# Altium footprint library PcbLib_jp.PcbLib: 255 footprints (part 13 of 16)
Each footprint in its own frame and in the unit in brackets; x right, y up, seen from the top. Pads: shape width x height; smd on the part's side, far side on the other; paste and mask are expansions set on the pad; w line width, h text height; cw(c..) or ccw(c..) is an arc to the next point about the centre after c.
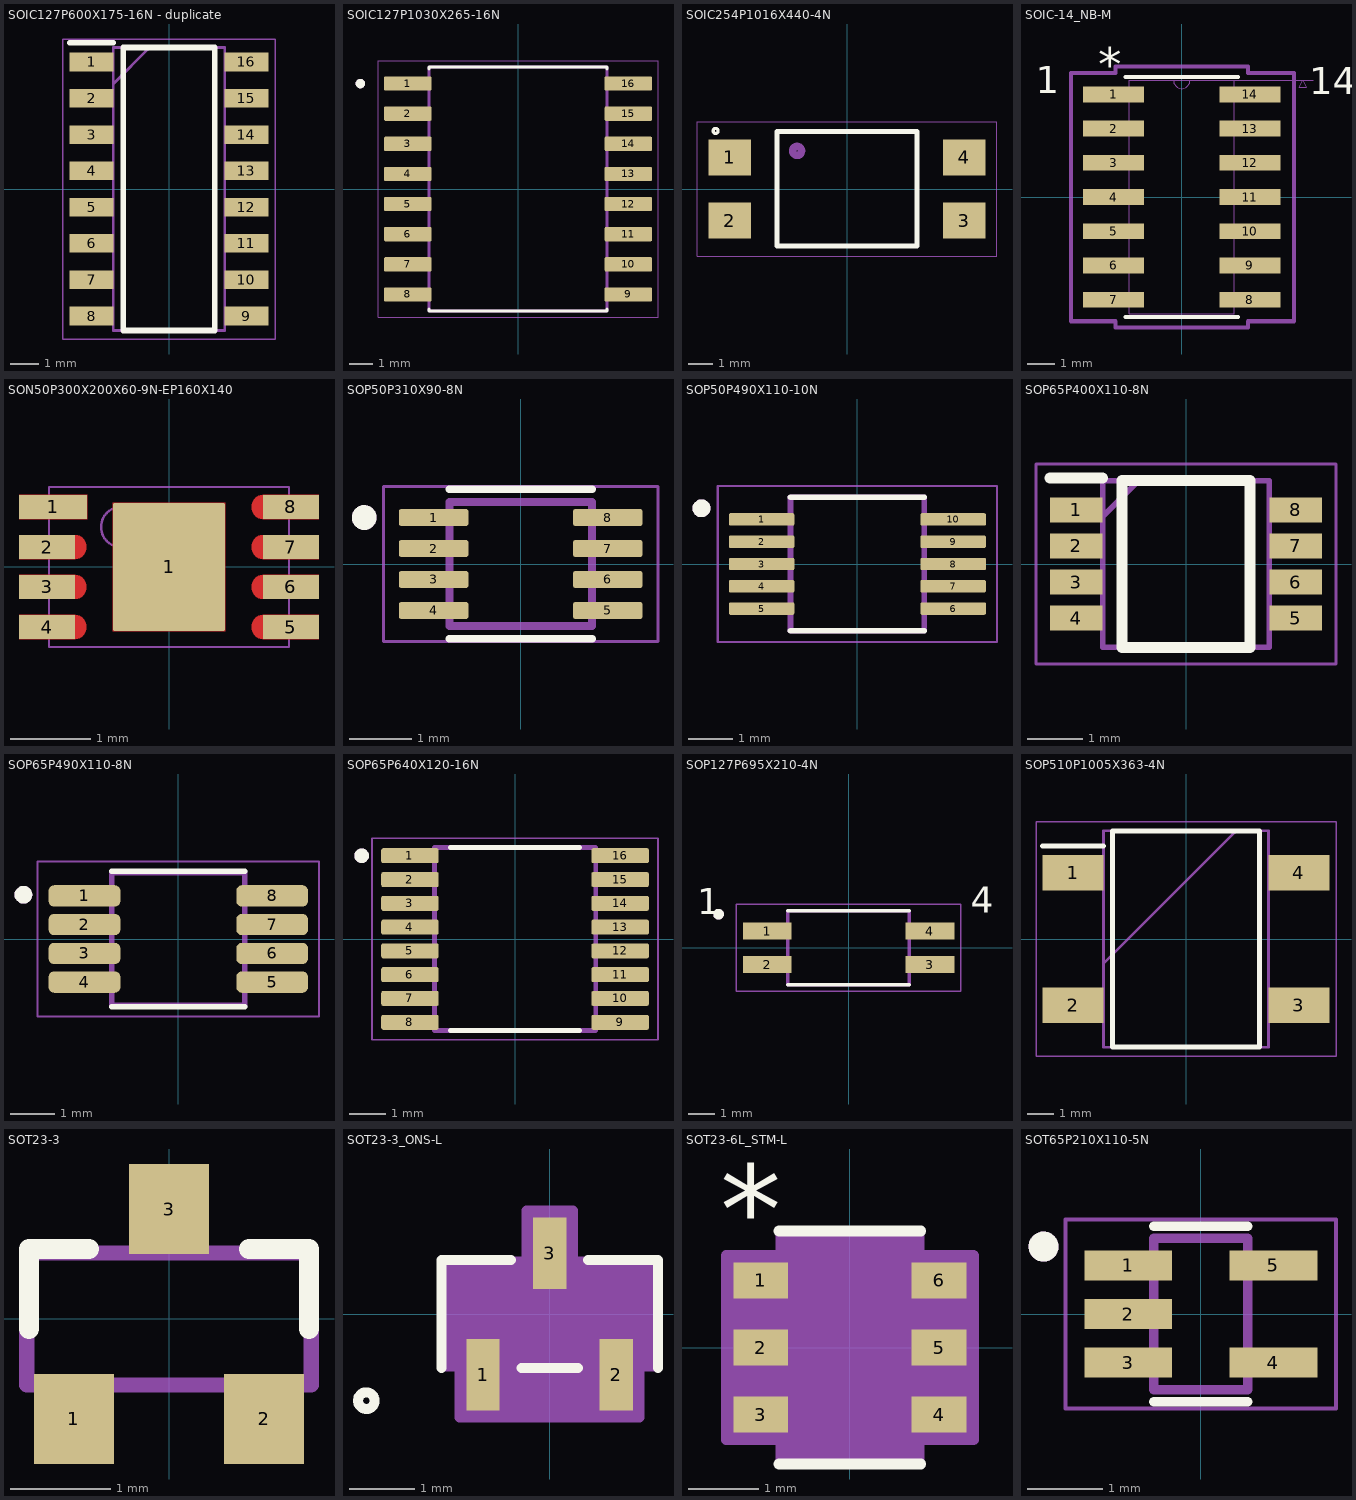
[diagram p12: the footprints below, top view; thin cyan lines are the x and y axes]

## SOIC127P600X175-16N - duplicate [mm]
pads (16):
  rect 1.525x0.65 smd: 1(-2.712,4.445) 2(-2.712,3.175) 3(-2.712,1.905) 4(-2.712,0.635) 5(-2.712,-0.635) 6(-2.712,-1.905) 7(-2.712,-3.175) 8(-2.712,-4.445) 9(2.712,-4.445) 10(2.712,-3.175) 11(2.712,-1.905) 12(2.712,-0.635) 13(2.712,0.635) 14(2.712,1.905) 15(2.712,3.175) 16(2.712,4.445)
Top Overlay:
  lines w0.2: -3.475,5.12 -1.95,5.12 ; -1.6,-4.95 -1.6,4.95 1.6,4.95 1.6,-4.95 -1.6,-4.95
Mechanical 13:
  lines w0.1: -1.95,3.68 -0.68,4.95 ; -1.95,-4.95 -1.95,4.95 1.95,4.95 1.95,-4.95 -1.95,-4.95
Mechanical 15:
  lines w0.05: -3.725,-5.25 -3.725,5.25 3.725,5.25 3.725,-5.25 -3.725,-5.25
3D body "ULN2002D1013TR.stp": height 1.75, standoff 0, extent -3,-4.95 3,4.95

## SOIC127P1030X265-16N [mm]
height 2.65
pads (16):
  rrect17% 2x0.6 smd mask+0: 1(-4.65,4.445) 2(-4.65,3.175) 3(-4.65,1.905) 4(-4.65,0.635) 5(-4.65,-0.635) 6(-4.65,-1.905) 7(-4.65,-3.175) 8(-4.65,-4.445) 9(4.65,-4.445) 10(4.65,-3.175) 11(4.65,-1.905) 12(4.65,-0.635) 13(4.65,0.635) 14(4.65,1.905) 15(4.65,3.175) 16(4.65,4.445)
Top Overlay:
  circle w0.2: c-6.65,4.445 r0.1
  lines w0.127: -3.75,-5.065 -3.75,-5.15 3.75,-5.15 3.75,-5.065 ; -3.75,5.065 -3.75,5.15 3.75,5.15 3.75,5.065
Top Solder:
  drawing of 16 lines, arcs and shapes, not listed
Mechanical 13:
  circle w0.2: c-6.65,4.445 r0.1
  lines w0.127: -3.75,-5.15 -3.75,5.15 3.75,5.15 3.75,-5.15 -3.75,-5.15
Mechanical 15:
  lines w0.05: -5.9,-5.4 5.9,-5.4 5.9,5.4 -5.9,5.4 -5.9,-5.4
3D body "step_temp.STEP": height 2.65, standoff 0, extent -5.15,-5.15 5.15,5.15

## SOIC254P1016X440-4N [mm]
pads (4):
  rect 1.7x1.45 smd: 1(-4.7,1.27) 2(-4.7,-1.27) 3(4.7,-1.27) 4(4.7,1.27)
Top Overlay:
  circle w0.127: c-5.273,2.33 r0.1
  lines w0.2: -2.8,2.29 -2.8,-2.29 2.8,-2.29 2.8,2.29 ; -2.8,2.3 2.8,2.3
Mechanical 13:
  circle w0.3: c-2.003,1.53 r0.18
Mechanical 15:
  lines w0.05: -6.02,-2.7 6.02,-2.7 6.02,2.7 -6.02,2.7 -6.02,-2.7
3D body "User Library-FOD817.step": height 5.4, standoff 0.8, extent -5.19,-2.62 5.27,2.48

## SOIC-14_NB-M [mil]
pads (14):
  rect 89x23 smd paste+0 mask+0: 1(-99.5,150) 2(-99.5,100) 3(-99.5,50) 4(-99.5,0) 5(-99.5,-50) 6(-99.5,-100) 7(-99.5,-150) 8(99.5,-150) 9(99.5,-100) 10(99.5,-50) 11(99.5,0) 12(99.5,50) 13(99.5,100) 14(99.5,150)
Top Overlay:
  lines w6: -82,-175.5 82,-175.5 ; -82,175.5 82,175.5
  text "*" at -122,168 h50
  text "14" at 186,150 h39.37
  text "1" at -213,152 h39.37
Mechanical 7:
  lines w1: 0,170.5 192,170.5 ; 172,160.5 177,170.5 182,160.5 172,160.5
Mechanical 13:
  lines w0: -12,170.5 ccw(c0,170.5) 12,170.5
  lines w1: -122,-159.5 -122,-140.5 -77,-140.5 -77,-159.5 -122,-159.5 ; -122,-109.5 -122,-90.5 -77,-90.5 -77,-109.5 -122,-109.5 ; -122,-59.5 -122,-40.5 -77,-40.5 -77,-59.5 -122,-59.5 ; -122,-9.5 -122,9.5 -77,9.5 -77,-9.5 -122,-9.5 ; -122,40.5 -122,59.5 -77,59.5 -77,40.5 -122,40.5 ; -122,90.5 -122,109.5 -77,109.5 -77,90.5 -122,90.5 ; -122,140.5 -122,159.5 -77,159.5 -77,140.5 -122,140.5 ; -77,-170.5 77,-170.5 77,170.5 -77,170.5 -77,-170.5 ; 77,-159.5 77,-140.5 122,-140.5 122,-159.5 77,-159.5 ; 77,-109.5 77,-90.5 122,-90.5 122,-109.5 77,-109.5 ; 77,-59.5 77,-40.5 122,-40.5 122,-59.5 77,-59.5 ; 77,-9.5 77,9.5 122,9.5 122,-9.5 77,-9.5 ; 77,40.5 77,59.5 122,59.5 122,40.5 77,40.5 ; 77,90.5 77,109.5 122,109.5 122,90.5 77,90.5 ; 77,140.5 77,159.5 122,159.5 122,140.5 77,140.5
  text "*" at -74.5,117.5 h50
Mechanical 15:
  lines w6: -162,-181.5 -162,181.5 -97,181.5 -97,190.5 97,190.5 97,181.5 164,181.5 164,-181.5 97,-181.5 97,-190.5 -97,-190.5 -97,-181.5 -162,-181.5
3D body: height 10, standoff 0, extent 0,0 10,10
3D body "SOIC-14_NB-M.step": height 69.09, standoff 0, extent -120,-172.5 124.01,168.52

## SON50P300X200X60-9N-EP160X140 [mm]
pads (9):
  rrect3% 0.85x0.3 smd paste-1 mask+0: 1(-1.45,0.75)
  rrect3% 1.4x1.6 smd paste-2 mask+0: 1(0,0)
  rrect3% 0.7x0.3 smd paste-1 mask+0: 2(-1.525,0.25) 3(-1.525,-0.25) 4(-1.525,-0.75) 5(1.525,-0.75) 6(1.525,-0.25) 7(1.525,0.25) 8(1.525,0.75)
Top Layer:
  region: 1.875,0.6 1.175,0.6 1.168,0.6 1.16,0.601 1.153,0.602 1.146,0.603 1.139,0.605 1.132,0.607 1.125,0.609 1.118,0.612 1.111,0.615 1.105,0.619 1.099,0.623 1.093,0.627 1.087,0.631 1.081,0.636 1.076,0.641 1.071,0.646 1.066,0.652 1.062,0.658 1.058,0.664 1.054,0.67 1.05,0.676 1.047,0.683 1.044,0.69 1.042,0.697 1.04,0.704 1.038,0.711 1.037,0.718 1.036,0.725 1.035,0.733 1.035,0.74 1.035,0.76 1.035,0.767 1.036,0.775 1.037,0.782 1.038,0.789 1.04,0.796 1.042,0.803 1.044,0.81 1.047,0.817 1.05,0.824 1.054,0.83 1.058,0.836 1.062,0.842 1.066,0.848 1.071,0.854 1.076,0.859 1.081,0.864 1.087,0.869 1.093,0.873 1.099,0.877 1.105,0.881 1.111,0.885 1.118,0.888 1.125,0.891 1.132,0.893 1.139,0.895 1.146,0.897 1.153,0.898 1.16,0.899 1.168,0.9 1.175,0.9 1.875,0.9
  region: 1.875,0.1 1.175,0.1 1.168,0.1 1.16,0.101 1.153,0.102 1.146,0.103 1.139,0.105 1.132,0.107 1.125,0.109 1.118,0.112 1.111,0.115 1.105,0.119 1.099,0.123 1.093,0.127 1.087,0.131 1.081,0.136 1.076,0.141 1.071,0.146 1.066,0.152 1.062,0.158 1.058,0.164 1.054,0.17 1.05,0.176 1.047,0.183 1.044,0.19 1.042,0.197 1.04,0.204 1.038,0.211 1.037,0.218 1.036,0.225 1.035,0.233 1.035,0.24 1.035,0.26 1.035,0.267 1.036,0.275 1.037,0.282 1.038,0.289 1.04,0.296 1.042,0.303 1.044,0.31 1.047,0.317 1.05,0.324 1.054,0.33 1.058,0.336 1.062,0.342 1.066,0.348 1.071,0.354 1.076,0.359 1.081,0.364 1.087,0.369 1.093,0.373 1.099,0.377 1.105,0.381 1.111,0.385 1.118,0.388 1.125,0.391 1.132,0.393 1.139,0.395 1.146,0.397 1.153,0.398 1.16,0.399 1.168,0.4 1.175,0.4 1.875,0.4
  region: 1.875,-0.4 1.175,-0.4 1.168,-0.4 1.16,-0.399 1.153,-0.398 1.146,-0.397 1.139,-0.395 1.132,-0.393 1.125,-0.391 1.118,-0.388 1.111,-0.385 1.105,-0.381 1.099,-0.377 1.093,-0.373 1.087,-0.369 1.081,-0.364 1.076,-0.359 1.071,-0.354 1.066,-0.348 1.062,-0.342 1.058,-0.336 1.054,-0.33 1.05,-0.324 1.047,-0.317 1.044,-0.31 1.042,-0.303 1.04,-0.296 1.038,-0.289 1.037,-0.282 1.036,-0.275 1.035,-0.267 1.035,-0.26 1.035,-0.24 1.035,-0.233 1.036,-0.225 1.037,-0.218 1.038,-0.211 1.04,-0.204 1.042,-0.197 1.044,-0.19 1.047,-0.183 1.05,-0.176 1.054,-0.17 1.058,-0.164 1.062,-0.158 1.066,-0.152 1.071,-0.146 1.076,-0.141 1.081,-0.136 1.087,-0.131 1.093,-0.127 1.099,-0.123 1.105,-0.119 1.111,-0.115 1.118,-0.112 1.125,-0.109 1.132,-0.107 1.139,-0.105 1.146,-0.103 1.153,-0.102 1.16,-0.101 1.168,-0.1 1.175,-0.1 1.875,-0.1
  region: 1.875,-0.9 1.175,-0.9 1.168,-0.9 1.16,-0.899 1.153,-0.898 1.146,-0.897 1.139,-0.895 1.132,-0.893 1.125,-0.891 1.118,-0.888 1.111,-0.885 1.105,-0.881 1.099,-0.877 1.093,-0.873 1.087,-0.869 1.081,-0.864 1.076,-0.859 1.071,-0.854 1.066,-0.848 1.062,-0.842 1.058,-0.836 1.054,-0.83 1.05,-0.824 1.047,-0.817 1.044,-0.81 1.042,-0.803 1.04,-0.796 1.038,-0.789 1.037,-0.782 1.036,-0.775 1.035,-0.767 1.035,-0.76 1.035,-0.74 1.035,-0.733 1.036,-0.725 1.037,-0.718 1.038,-0.711 1.04,-0.704 1.042,-0.697 1.044,-0.69 1.047,-0.683 1.05,-0.676 1.054,-0.67 1.058,-0.664 1.062,-0.658 1.066,-0.652 1.071,-0.646 1.076,-0.641 1.081,-0.636 1.087,-0.631 1.093,-0.627 1.099,-0.623 1.105,-0.619 1.111,-0.615 1.118,-0.612 1.125,-0.609 1.132,-0.607 1.139,-0.605 1.146,-0.603 1.153,-0.602 1.16,-0.601 1.168,-0.6 1.175,-0.6 1.875,-0.6
  region: -1.168,-0.6 -1.16,-0.601 -1.153,-0.602 -1.146,-0.603 -1.139,-0.605 -1.132,-0.607 -1.125,-0.609 -1.118,-0.612 -1.111,-0.615 -1.105,-0.619 -1.099,-0.623 -1.093,-0.627 -1.087,-0.631 -1.081,-0.636 -1.076,-0.641 -1.071,-0.646 -1.066,-0.652 -1.062,-0.658 -1.058,-0.664 -1.054,-0.67 -1.05,-0.676 -1.047,-0.683 -1.044,-0.69 -1.042,-0.697 -1.04,-0.704 -1.038,-0.711 -1.037,-0.718 -1.036,-0.725 -1.035,-0.733 -1.035,-0.74 -1.035,-0.76 -1.035,-0.767 -1.036,-0.775 -1.037,-0.782 -1.038,-0.789 -1.04,-0.796 -1.042,-0.803 -1.044,-0.81 -1.047,-0.817 -1.05,-0.824 -1.054,-0.83 -1.058,-0.836 -1.062,-0.842 -1.066,-0.848 -1.071,-0.854 -1.076,-0.859 -1.081,-0.864 -1.087,-0.869 -1.093,-0.873 -1.099,-0.877 -1.105,-0.881 -1.111,-0.885 -1.118,-0.888 -1.125,-0.891 -1.132,-0.893 -1.139,-0.895 -1.146,-0.897 -1.153,-0.898 -1.16,-0.899 -1.168,-0.9 -1.175,-0.9 -1.875,-0.9 -1.875,-0.6 -1.175,-0.6
  region: -1.168,-0.1 -1.16,-0.101 -1.153,-0.102 -1.146,-0.103 -1.139,-0.105 -1.132,-0.107 -1.125,-0.109 -1.118,-0.112 -1.111,-0.115 -1.105,-0.119 -1.099,-0.123 -1.093,-0.127 -1.087,-0.131 -1.081,-0.136 -1.076,-0.141 -1.071,-0.146 -1.066,-0.152 -1.062,-0.158 -1.058,-0.164 -1.054,-0.17 -1.05,-0.176 -1.047,-0.183 -1.044,-0.19 -1.042,-0.197 -1.04,-0.204 -1.038,-0.211 -1.037,-0.218 -1.036,-0.225 -1.035,-0.233 -1.035,-0.24 -1.035,-0.26 -1.035,-0.267 -1.036,-0.275 -1.037,-0.282 -1.038,-0.289 -1.04,-0.296 -1.042,-0.303 -1.044,-0.31 -1.047,-0.317 -1.05,-0.324 -1.054,-0.33 -1.058,-0.336 -1.062,-0.342 -1.066,-0.348 -1.071,-0.354 -1.076,-0.359 -1.081,-0.364 -1.087,-0.369 -1.093,-0.373 -1.099,-0.377 -1.105,-0.381 -1.111,-0.385 -1.118,-0.388 -1.125,-0.391 -1.132,-0.393 -1.139,-0.395 -1.146,-0.397 -1.153,-0.398 -1.16,-0.399 -1.168,-0.4 -1.175,-0.4 -1.875,-0.4 -1.875,-0.1 -1.175,-0.1
  region: -1.168,0.4 -1.16,0.399 -1.153,0.398 -1.146,0.397 -1.139,0.395 -1.132,0.393 -1.125,0.391 -1.118,0.388 -1.111,0.385 -1.105,0.381 -1.099,0.377 -1.093,0.373 -1.087,0.369 -1.081,0.364 -1.076,0.359 -1.071,0.354 -1.066,0.348 -1.062,0.342 -1.058,0.336 -1.054,0.33 -1.05,0.324 -1.047,0.317 -1.044,0.31 -1.042,0.303 -1.04,0.296 -1.038,0.289 -1.037,0.282 -1.036,0.275 -1.035,0.267 -1.035,0.26 -1.035,0.24 -1.035,0.233 -1.036,0.225 -1.037,0.218 -1.038,0.211 -1.04,0.204 -1.042,0.197 -1.044,0.19 -1.047,0.183 -1.05,0.176 -1.054,0.17 -1.058,0.164 -1.062,0.158 -1.066,0.152 -1.071,0.146 -1.076,0.141 -1.081,0.136 -1.087,0.131 -1.093,0.127 -1.099,0.123 -1.105,0.119 -1.111,0.115 -1.118,0.112 -1.125,0.109 -1.132,0.107 -1.139,0.105 -1.146,0.103 -1.153,0.102 -1.16,0.101 -1.168,0.1 -1.175,0.1 -1.875,0.1 -1.875,0.4 -1.175,0.4
  region: -1.022,0.597 -1.873,0.597 -1.873,0.902 -1.022,0.902
  region: 0.7,-0.8 -0.7,-0.8 -0.7,0.8 0.7,0.8
Top Paste:
  drawing of 12 lines, arcs and shapes, not listed
Mechanical 13:
  circle w0.03: c-0.6,0.5 r0.25
  lines w0.025: -1.5,-1 1.5,-1 1.5,1 -1.5,1 -1.5,-1
Mechanical 15:
  circle w0.05: c0,0 r0.25
  lines w0.05: -0.35,0 0.35,0 ; 0,-0.35 0,0.35
3D body "ATECC508A-MAHDA-T.STEP": height 0.6, standoff 0, extent -1.45,-1.02 1.55,0.98

## SOP50P310X90-8N [mm]
pads (8):
  rrect25% 1.12x0.27 smd: 1(-1.405,0.75) 2(-1.405,0.25) 3(-1.405,-0.25) 4(-1.405,-0.75) 5(1.405,-0.75) 6(1.405,-0.25) 7(1.405,0.25) 8(1.405,0.75)
Top Overlay:
  circle w0.2: c-2.525,0.75 r0.1
  lines w0.127: -1.15,-1.205 1.15,-1.205 ; -1.15,1.205 1.15,1.205
Mechanical 13:
  circle w0.2: c-2.525,0.75 r0.1
  lines w0.127: -1.15,-1 1.15,-1 1.15,1 -1.15,1 -1.15,-1
Mechanical 15:
  lines w0.05: -2.215,-1.25 2.215,-1.25 2.215,1.25 -2.215,1.25 -2.215,-1.25
3D body "step_temp.STEP": height 0.9, standoff 0, extent -1.55,-1 1.55,1

## SOP50P490X110-10N [mm]
pads (10):
  rrect25% 1.47x0.28 smd: 1(-2.15,1) 2(-2.15,0.5) 3(-2.15,0) 4(-2.15,-0.5) 5(-2.15,-1) 6(2.15,-1) 7(2.15,-0.5) 8(2.15,0) 9(2.15,0.5) 10(2.15,1)
Top Overlay:
  circle w0.2: c-3.5,1.25 r0.1
  lines w0.127: -1.5,-1.5 1.5,-1.5 ; -1.5,1.5 1.5,1.5
Mechanical 13:
  circle w0.2: c-3.5,1.25 r0.1
  lines w0.127: -1.5,-1.5 -1.5,1.5 1.5,1.5 1.5,-1.5 -1.5,-1.5
Mechanical 15:
  lines w0.05: -3.135,-1.75 -3.135,1.75 3.135,1.75 3.135,-1.75 -3.135,-1.75
3D body "ADS1115IDGST.STEP": height 1.1, standoff 0, extent -2.526,-1.5 2.374,1.5

## SOP65P400X110-8N [mm]
pads (8):
  rect 0.95x0.45 smd: 1(-1.975,0.975) 2(-1.975,0.325) 3(-1.975,-0.325) 4(-1.975,-0.975) 5(1.975,-0.975) 6(1.975,-0.325) 7(1.975,0.325) 8(1.975,0.975)
Top Overlay:
  lines w0.2: -2.45,1.55 -1.5,1.55 ; -1.15,-1.5 -1.15,1.5 1.15,1.5 1.15,-1.5 -1.15,-1.5
Mechanical 13:
  lines w0.1: -1.5,0.85 -0.85,1.5 ; -1.5,-1.5 -1.5,1.5 1.5,1.5 1.5,-1.5 -1.5,-1.5
Mechanical 15:
  lines w0.05: -2.7,-1.8 -2.7,1.8 2.7,1.8 2.7,-1.8 -2.7,-1.8
3D body "74HC2G00DP,125.stp": height 0.93, standoff 0, extent -2.013,-1.5 2.011,1.5

## SOP65P490X110-8N [mm]
pads (8):
  rrect50% 1.62x0.48 smd: 1(-2.12,0.975) 2(-2.12,0.325) 3(-2.12,-0.325) 4(-2.12,-0.975) 5(2.12,-0.975) 6(2.12,-0.325) 7(2.12,0.325) 8(2.12,0.975)
Top Overlay:
  circle w0.2: c-3.5,1 r0.1
  lines w0.127: -1.5,-1.529 1.5,-1.529 ; -1.5,1.529 1.5,1.529
Mechanical 13:
  circle w0.2: c-3.5,1 r0.1
  lines w0.127: -1.5,-1.5 1.5,-1.5 1.5,1.5 -1.5,1.5 -1.5,-1.5
Mechanical 15:
  lines w0.05: -3.18,-1.75 3.18,-1.75 3.18,1.75 -3.18,1.75 -3.18,-1.75
3D body "MC100EP16DTR2G.STEP": height 1.1, standoff 0, extent -2.42,-1.53 2.48,1.47

## SOP65P640X120-16N [mm]
pads (16):
  rrect25% 1.57x0.41 smd: 1(-2.87,2.275) 2(-2.87,1.625) 3(-2.87,0.975) 4(-2.87,0.325) 5(-2.87,-0.325) 6(-2.87,-0.975) 7(-2.87,-1.625) 8(-2.87,-2.275) 9(2.87,-2.275) 10(2.87,-1.625) 11(2.87,-0.975) 12(2.87,-0.325) 13(2.87,0.325) 14(2.87,0.975) 15(2.87,1.625) 16(2.87,2.275)
Top Overlay:
  circle w0.2: c-4.19,2.275 r0.1
  lines w0.127: -1.765,-2.5 1.765,-2.5 ; -1.765,2.5 1.765,2.5
Mechanical 13:
  circle w0.2: c-4.19,2.275 r0.1
  lines w0.127: -2.2,-2.5 2.2,-2.5 2.2,2.5 -2.2,2.5 -2.2,-2.5
Mechanical 15:
  lines w0.05: -3.905,-2.75 3.905,-2.75 3.905,2.75 -3.905,2.75 -3.905,-2.75
3D body "SN74AXC4T774PWR.step": height 1.2, standoff 0, extent -3.25,-2.49 3.15,2.51

## SOP127P695X210-4N [mm]
pads (4):
  rect 1.84x0.64 smd: 1(-3.085,0.635) 2(-3.085,-0.635) 3(3.085,-0.635) 4(3.085,0.635)
Top Overlay:
  circle w0.2: c-4.925,1.275 r0.1
  lines w0.127: -2.3,-1.4 2.3,-1.4 ; -2.3,1.4 2.3,1.4
  text "1" at -5.74,1.27 h1
  text "4" at 4.623,1.321 h1
Mechanical 13:
  circle w0.2: c-4.925,1.275 r0.1
  circle w0.2: c-4.925,1.275 r0.1
  lines w0.127: -2.3,-1.4 -2.3,1.4 ; -2.3,-1.4 2.3,-1.4 ; -2.3,-1.4 -2.3,1.4 ; -2.3,-1.4 2.3,-1.4 ; -2.3,1.4 2.3,1.4 ; -2.3,1.4 2.3,1.4 ; 2.3,-1.4 2.3,1.4 ; 2.3,-1.4 2.3,1.4
Mechanical 16:
  lines w0.05: -4.255,-1.65 -4.255,1.65 4.255,1.65 4.255,-1.65 -4.255,-1.65
3D body "User Library-SOP-4-1.STEP": height 2.1, standoff 0, extent -3.525,-1.375 3.475,1.425

## SOP510P1005X363-4N [mm]
pads (4):
  rect 2.35x1.35 smd: 1(-4.35,2.55) 2(-4.35,-2.55) 3(4.35,-2.55) 4(4.35,2.55)
Top Overlay:
  lines w0.2: -5.525,3.575 -3.175,3.575 ; -2.825,-4.16 -2.825,4.16 2.825,4.16 2.825,-4.16 -2.825,-4.16
Mechanical 13:
  lines w0.1: -3.175,-0.94 1.925,4.16 ; -3.175,-4.16 -3.175,4.16 3.175,4.16 3.175,-4.16 -3.175,-4.16
Mechanical 15:
  lines w0.05: -5.775,-4.505 -5.775,4.505 5.775,4.505 5.775,-4.505 -5.775,-4.505
3D body "DF01SA-E3_45.stp": height 3.63, standoff 0, extent -5.025,-4.16 5.025,4.16

## SOT23-3 [mm]
pads (3):
  rect 0.8x0.9 smd: 1(-0.95,-1) 2(0.95,-1) 3(0,1.1)
Top Overlay:
  lines w0.203: -1.4,-0.1 -1.4,0.7 -0.8,0.7 ; 0.8,0.7 1.4,0.7 1.4,-0.1
Mechanical 13:
  lines w0.152: -1.422,-0.66 1.422,-0.66 1.422,0.66 -1.422,0.66 -1.422,-0.66
3D body "step_temp.STEP": height 1.17, standoff 0, extent -1.45,-1.148 1.45,1.148

## SOT23-3_ONS-L [mil]
pads (3):
  rect 20x43 smd paste+0 mask+0: 1(-40,-36.5) 2(40,-36.5) 3(0,36.5)
Top Overlay:
  circle w6: c-110,-52 r5
  lines w6: -65,-32.5 -65,32.5 -23.1,32.5 ; -16.9,-32.5 16.9,-32.5 ; 23.1,32.5 65,32.5 65,-32.5
Mechanical 13:
  circle w0: c-50,-17.5 r5
  lines w1: -60,-27.5 -60,27.5 60,27.5 60,-27.5 -60,-27.5 ; -50,-52 -30,-52 -30,-27.5 -50,-27.5 -50,-52 ; -10,27.5 -10,52 10,52 10,27.5 -10,27.5 ; 30,-52 50,-52 50,-27.5 30,-27.5 30,-52
Mechanical 15:
  region: 60,-27.5 -60,-27.5 -60,27.5 60,27.5
  region: -64,-31.5 -64,31.5 -14,31.5 -14,62 14,62 14,31.5 64,31.5 64,-31.5 54,-31.5 54,-62 -54,-62 -54,-31.5
  lines w6: -64,-31.5 -54,-31.5 -54,-62 54,-62 54,-31.5 64,-31.5 64,31.5 14,31.5 14,62 -14,62 -14,31.5 -64,31.5 -64,-31.5
3D body "SOT23-3_ONS.step": height 44.09, standoff 0, extent -60,-52.01 60,52.01

## SOT23-6L_STM-L [mil]
pads (6):
  rect 30.5x20 smd paste+0 mask+0: 1(-49.75,37.4) 2(-49.75,0) 3(-49.75,-37.4) 4(49.75,-37.4) 5(49.75,0) 6(49.75,37.4)
Top Overlay:
  lines w6: -39.5,-65 39.5,-65 ; -39.5,65 39.5,65
  text "*" at -72.25,52.4 h50
Mechanical 13:
  lines w0: -12,60 ccw(c0,60) 12,60
  lines w1: -59,-47.4 -34.5,-47.4 -34.5,-27.4 -59,-27.4 -59,-47.4 ; -59,-10 -34.5,-10 -34.5,10 -59,10 -59,-10 ; -59,27.4 -34.5,27.4 -34.5,47.4 -59,47.4 -59,27.4 ; -34.5,-60 -34.5,60 34.5,60 34.5,-60 -34.5,-60 ; 34.5,-47.4 59,-47.4 59,-27.4 34.5,-27.4 34.5,-47.4 ; 34.5,-10 59,-10 59,10 34.5,10 34.5,-10 ; 34.5,27.4 59,27.4 59,47.4 34.5,47.4 34.5,27.4
  text "*" at -32,7 h50
Mechanical 15:
  region: -38.5,-51.4 -69,-51.4 -69,51.4 -38.5,51.4 -38.5,64 38.5,64 38.5,51.4 69,51.4 69,-51.4 38.5,-51.4 38.5,-64 -38.5,-64
  lines w6: -69,-51.4 -38.5,-51.4 -38.5,-64 38.5,-64 38.5,-51.4 69,-51.4 69,51.4 38.5,51.4 38.5,64 -38.5,64 -38.5,51.4 -69,51.4 -69,-51.4
3D body "SOT23-6L_STM.step": height 57.09, standoff 0, extent -59.02,-60 59.02,60

## SOT65P210X110-5N [mm]
pads (5):
  rect 1.17x0.4 smd: 1(-0.97,0.65) 2(-0.97,0) 3(-0.97,-0.65) 4(0.97,-0.65) 5(0.97,0.65)
Top Overlay:
  circle w0.2: c-2.1,0.9 r0.1
  lines w0.127: -0.625,-1.17 0.625,-1.17 ; -0.625,1.17 0.625,1.17
Mechanical 13:
  circle w0.2: c-2.1,0.9 r0.1
  lines w0.127: -0.625,-1.012 0.625,-1.012 0.625,1.012 -0.625,1.012 -0.625,-1.012
Mechanical 15:
  lines w0.05: -1.805,-1.262 1.805,-1.262 1.805,1.262 -1.805,1.262 -1.805,-1.262
3D body "SN74LVC1G08DCKR.step": height 1.1, standoff 0, extent -0.923,-1 1.177,1